# Altium footprint library PCB_CONNECTORS.PcbLib: 676 footprints (part 24 of 43)
Each footprint in its own frame and in the unit in brackets; x right, y up, seen from the top. Pads: shape width x height; smd on the part's side, far side on the other; paste and mask are expansions set on the pad; w line width, h text height; cw(c..) or ccw(c..) is an arc to the next point about the centre after c.
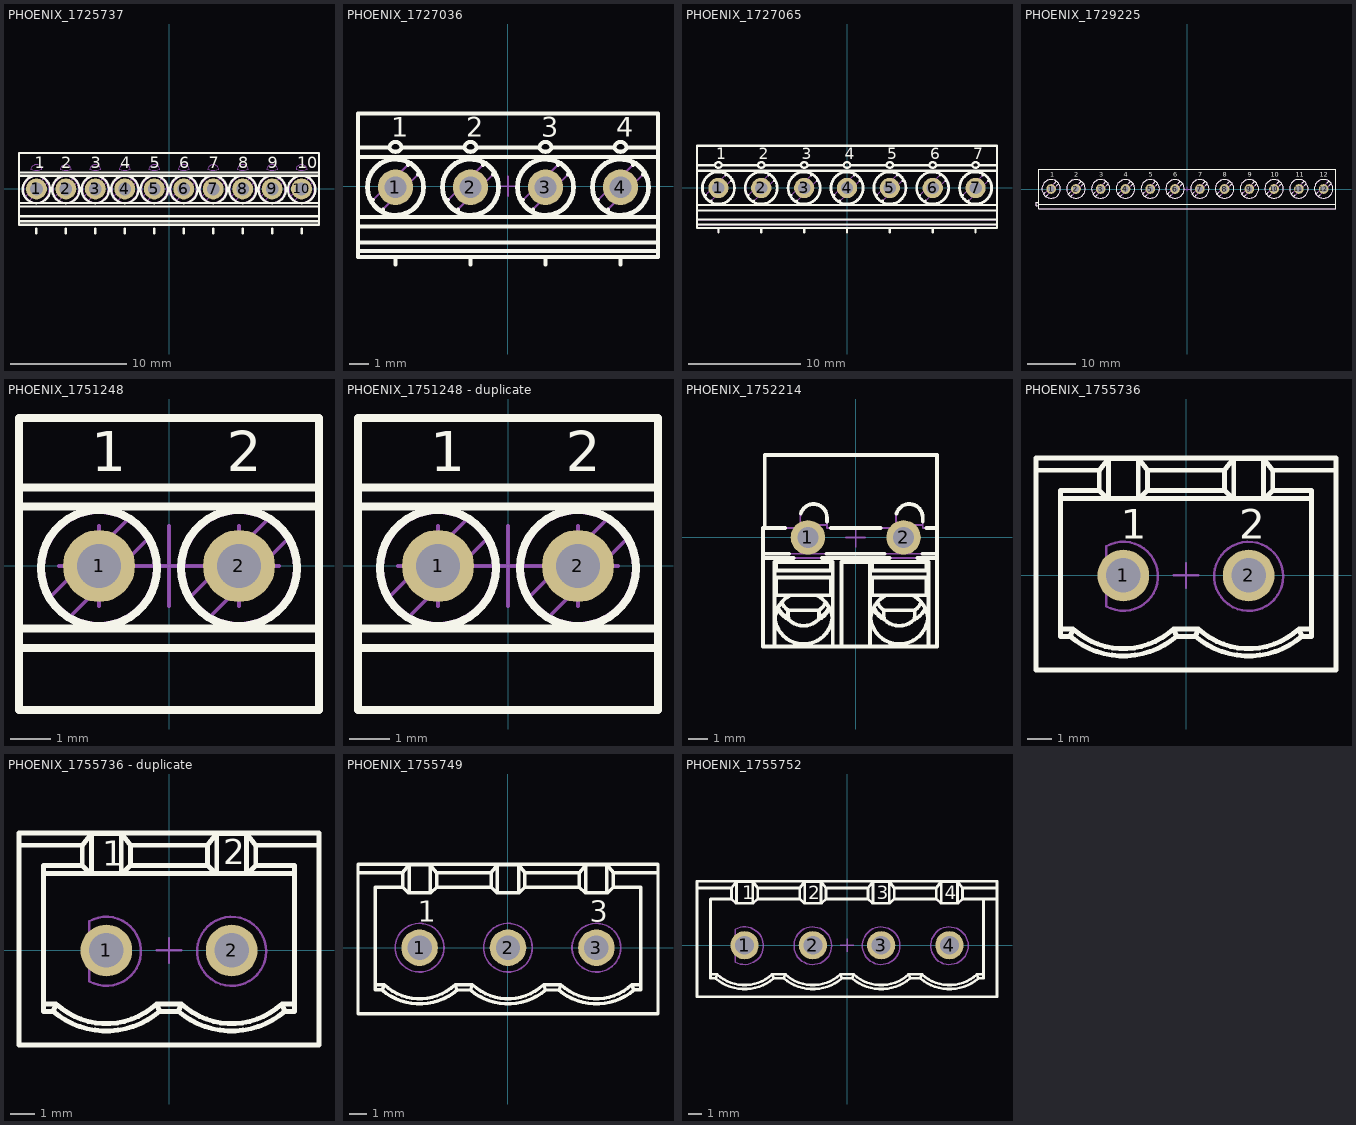
[diagram p23: the footprints below, top view; thin cyan lines are the x and y axes]

## PHOENIX_1725737 [mm] "Micro PCB Terminal Block, Pitch 2.54mm, 10 Positions, Screw Connection"
height 8.5
pads (10):
  round 1.8 hole 1.1: 1(-11.43,0) 2(-8.89,0) 3(-6.35,0) 4(-3.81,0) 5(-1.27,0) 6(1.27,0) 7(3.81,0) 8(6.35,0) 9(8.89,0) 10(11.43,0)
Top Overlay:
  circle w0.2: c-11.43,-0.05 r1.18
  circle w0.2: c-8.89,-0.05 r1.18
  circle w0.2: c-6.35,-0.05 r1.18
  circle w0.2: c-3.81,-0.05 r1.18
  circle w0.2: c-1.27,-0.05 r1.18
  circle w0.2: c1.27,-0.05 r1.18
  circle w0.2: c3.81,-0.05 r1.18
  circle w0.2: c6.35,-0.05 r1.18
  circle w0.2: c8.89,-0.05 r1.18
  circle w0.2: c11.43,-0.05 r1.18
  lines w0.2: -12.93,-2.8 12.93,-2.8 ; -12.93,-2.361 12.93,-2.361 ; -12.93,-1.51 12.93,-1.51 ; -12.93,-1.22 12.93,-1.22 ; -12.93,1.132 12.93,1.132 ; -12.93,1.417 12.93,1.417 ; -11.43,-3.81 -11.43,-3.429 ; -8.89,-3.81 -8.89,-3.429 ; -6.35,-3.81 -6.35,-3.429 ; -3.81,-3.81 -3.81,-3.429 ; -1.27,-3.81 -1.27,-3.429 ; 1.27,-3.81 1.27,-3.429 ; 3.81,-3.81 3.81,-3.429 ; 6.35,-3.81 6.35,-3.429 ; 8.89,-3.81 8.89,-3.429 ; 11.43,-3.81 11.43,-3.429 ; -12.93,-3.1 12.93,-3.1 12.93,3.1 -12.93,3.1 -12.93,-3.1
  text "9" at 8.509,1.778 h1
  text "8" at 5.969,1.778 h1
  text "6" at 0.889,1.778 h1
  text "4" at -4.191,1.778 h1
  text "1" at -11.557,1.778 h1
  text "2" at -9.271,1.778 h1
  text "3" at -6.731,1.778 h1
  text "5" at -1.651,1.778 h1
  text "7" at 3.429,1.778 h1
  text "10" at 11.049,1.778 h1
Mechanical 8:
  lines w0.1: -0.55,0 0,0 0,-0.55 ; -11.98,0 -11.43,0 ; -11.98,0 -11.43,0 ; -11.98,0 -11.43,0 ; -11.98,0 -11.43,0 ; -11.43,-0.55 -11.43,0 ; -11.43,-0.55 -11.43,0 ; -11.43,-0.55 -11.43,0 ; -11.43,-0.55 -11.43,0 ; -9.44,0 -8.89,0 ; -9.44,0 -8.89,0 ; -9.44,0 -8.89,0 ; -9.44,0 -8.89,0 ; -8.89,-0.55 -8.89,0 ; -8.89,-0.55 -8.89,0 ; -8.89,-0.55 -8.89,0 ; -8.89,-0.55 -8.89,0 ; -6.9,0 -6.35,0 ; -6.9,0 -6.35,0 ; -6.9,0 -6.35,0 ; -6.9,0 -6.35,0 ; -6.35,-0.55 -6.35,0 ; -6.35,-0.55 -6.35,0 ; -6.35,-0.55 -6.35,0 ; -6.35,-0.55 -6.35,0 ; -4.36,0 -3.81,0 ; -4.36,0 -3.81,0 ; -4.36,0 -3.81,0 ; -4.36,0 -3.81,0 ; -3.81,-0.55 -3.81,0 ; -3.81,-0.55 -3.81,0 ; -3.81,-0.55 -3.81,0 ; -3.81,-0.55 -3.81,0 ; -1.82,0 -1.27,0 ; -1.82,0 -1.27,0 ; -1.82,0 -1.27,0 ; -1.82,0 -1.27,0 ; -1.27,-0.55 -1.27,0 ; -1.27,-0.55 -1.27,0 ; -1.27,-0.55 -1.27,0 ; -1.27,-0.55 -1.27,0 ; 0.72,0 1.27,0 ; 0.72,0 1.27,0 ; 0.72,0 1.27,0 ; 0.72,0 1.27,0 ; 1.27,-0.55 1.27,0 ; 1.27,-0.55 1.27,0 ; 1.27,-0.55 1.27,0 ; 1.27,-0.55 1.27,0 ; 3.26,0 3.81,0 ; 3.26,0 3.81,0 ; 3.26,0 3.81,0 ; 3.26,0 3.81,0 ; 3.81,-0.55 3.81,0 ; 3.81,-0.55 3.81,0 ; 3.81,-0.55 3.81,0 ; 3.81,-0.55 3.81,0 ; 5.8,0 6.35,0 ; 5.8,0 6.35,0 ; 5.8,0 6.35,0 ; 5.8,0 6.35,0 ; 6.35,-0.55 6.35,0 ; 6.35,-0.55 6.35,0 ; 6.35,-0.55 6.35,0 ; 6.35,-0.55 6.35,0 ; 8.34,0 8.89,0 ; 8.34,0 8.89,0 ; 8.34,0 8.89,0 ; 8.34,0 8.89,0 ; 8.89,-0.55 8.89,0 ; 8.89,-0.55 8.89,0 ; 8.89,-0.55 8.89,0 ; 8.89,-0.55 8.89,0 ; 10.88,0 11.43,0 ; 10.88,0 11.43,0 ; 10.88,0 11.43,0 ; 10.88,0 11.43,0 ; 11.43,-0.55 11.43,0 ; 11.43,-0.55 11.43,0 ; 11.43,-0.55 11.43,0 ; 11.43,-0.55 11.43,0
Mechanical 14:
  circle w0.1: c8.89,-0.05 r1.1
  circle w0.1: c1.27,-0.05 r1.1
  circle w0.1: c-3.81,-0.05 r1.1
  circle w0.1: c-6.35,-0.05 r1.1
  circle w0.1: c-8.89,-0.05 r1.1
  circle w0.1: c-11.43,-0.05 r1.1
  circle w0.1: c-1.27,-0.05 r1.1
  circle w0.1: c3.81,-0.05 r1.1
  circle w0.1: c6.35,-0.05 r1.1
  circle w0.1: c11.43,-0.05 r1.1
  lines w0.1: -12.93,-2.8 12.93,-2.8 ; -12.93,-2.361 12.93,-2.361 ; -12.93,-1.51 12.93,-1.51 ; -12.93,-1.22 12.93,-1.22 ; -12.93,1.132 12.93,1.132 ; -12.93,1.417 12.93,1.417 ; -12.364,-0.631 -10.849,0.884 ; -12.011,-0.984 -10.496,0.531 ; -9.824,-0.631 -8.309,0.884 ; -9.471,-0.984 -7.956,0.531 ; -7.284,-0.631 -5.769,0.884 ; -6.931,-0.984 -5.416,0.531 ; -4.744,-0.631 -3.229,0.884 ; -4.391,-0.984 -2.876,0.531 ; -2.204,-0.631 -0.689,0.884 ; -1.851,-0.984 -0.336,0.531 ; 0.336,-0.631 1.851,0.884 ; 0.689,-0.984 2.204,0.531 ; 2.876,-0.631 4.391,0.884 ; 3.229,-0.984 4.744,0.531 ; 5.416,-0.631 6.931,0.884 ; 5.769,-0.984 7.284,0.531 ; 7.956,-0.631 9.471,0.884 ; 8.309,-0.984 9.824,0.531 ; 10.496,-0.631 12.011,0.884 ; 10.849,-0.984 12.364,0.531 ; -12.93,-3.1 12.93,-3.1 12.93,3.1 -12.93,3.1 -12.93,-3.1 ; -11.905,1.757 cw(c-11.43,1.6) -10.955,1.757 cw(c-11.003,1.741) -10.982,1.696 cw(c-11.43,2.696) -11.878,1.696 cw(c-11.857,1.741) -11.905,1.757 ; -9.365,1.757 cw(c-8.89,1.6) -8.415,1.757 cw(c-8.463,1.741) -8.442,1.696 cw(c-8.89,2.696) -9.338,1.696 cw(c-9.317,1.741) -9.365,1.757 ; -6.825,1.757 cw(c-6.35,1.6) -5.875,1.757 cw(c-5.923,1.741) -5.902,1.696 cw(c-6.35,2.696) -6.798,1.696 cw(c-6.777,1.741) -6.825,1.757 ; -4.285,1.757 cw(c-3.81,1.6) -3.335,1.757 cw(c-3.383,1.741) -3.362,1.696 cw(c-3.81,2.696) -4.258,1.696 cw(c-4.237,1.741) -4.285,1.757 ; -1.745,1.757 cw(c-1.27,1.6) -0.795,1.757 cw(c-0.843,1.741) -0.822,1.696 cw(c-1.27,2.696) -1.718,1.696 cw(c-1.697,1.741) -1.745,1.757 ; 0.795,1.757 cw(c1.27,1.6) 1.745,1.757 cw(c1.697,1.741) 1.718,1.696 cw(c1.27,2.696) 0.822,1.696 cw(c0.843,1.741) 0.795,1.757 ; 3.335,1.757 cw(c3.81,1.6) 4.285,1.757 cw(c4.237,1.741) 4.258,1.696 cw(c3.81,2.696) 3.362,1.696 cw(c3.383,1.741) 3.335,1.757 ; 5.875,1.757 cw(c6.35,1.6) 6.825,1.757 cw(c6.777,1.741) 6.798,1.696 cw(c6.35,2.696) 5.902,1.696 cw(c5.923,1.741) 5.875,1.757 ; 8.415,1.757 cw(c8.89,1.6) 9.365,1.757 cw(c9.317,1.741) 9.338,1.696 cw(c8.89,2.696) 8.442,1.696 cw(c8.463,1.741) 8.415,1.757 ; 10.955,1.757 ccw(c11.003,1.741) 10.982,1.696 ccw(c11.43,2.696) 11.878,1.696 ccw(c11.857,1.741) 11.905,1.757 ccw(c11.43,1.6) 10.955,1.757
3D body "PHOENIX_1725737.stp": height 8.5, standoff -3.5, extent -12.93,-3.1 12.93,3.1

## PHOENIX_1727036 [mm] "PCB Terminal Block, Pitch 3.81mm, 4 Positions, Screw Connection"
height 8.5
pads (4):
  round 1.8 hole 1.1: 1(-5.715,-0.05) 2(-1.905,-0.05) 3(1.905,-0.05) 4(5.715,-0.05)
Top Overlay:
  circle w0.2: c-5.715,-0.05 r1.4
  circle w0.2: c-1.905,-0.05 r1.4
  circle w0.2: c1.905,-0.05 r1.4
  circle w0.2: c5.715,-0.05 r1.4
  circle w0.2: c-5.715,-0.05 r1.45
  circle w0.2: c-1.905,-0.05 r1.45
  circle w0.2: c5.715,-0.05 r1.45
  circle w0.2: c1.905,-0.05 r1.45
  lines w0.2: -7.62,-3.3 7.62,-3.3 ; -7.62,-2.861 7.62,-2.861 ; -7.62,-2.049 7.62,-2.049 ; -7.62,-1.566 7.62,-1.566 ; -7.62,1.487 7.62,1.487 ; -7.62,1.962 -6.017,1.962 ; -6.921,-0.761 -6.848,-0.688 ; -6.426,-1.256 -6.353,-1.183 ; -5.715,-3.981 -5.715,-3.6 ; -5.413,1.962 -2.207,1.962 ; -5.077,1.083 -5.004,1.156 ; -4.582,0.588 -4.509,0.661 ; -3.111,-0.761 -3.038,-0.688 ; -2.616,-1.256 -2.543,-1.183 ; -1.905,-3.981 -1.905,-3.6 ; -1.603,1.962 1.603,1.962 ; -1.267,1.083 -1.194,1.156 ; -0.772,0.588 -0.699,0.661 ; 0.699,-0.761 0.772,-0.688 ; 1.194,-1.256 1.267,-1.183 ; 1.905,-3.981 1.905,-3.6 ; 2.207,1.962 5.413,1.962 ; 2.543,1.083 2.616,1.156 ; 3.038,0.588 3.111,0.661 ; 4.509,-0.761 4.582,-0.688 ; 5.004,-1.256 5.077,-1.183 ; 5.715,-3.981 5.715,-3.6 ; 6.017,1.962 7.62,1.962 ; 6.353,1.083 6.426,1.156 ; 6.848,0.588 6.921,0.661 ; -7.62,-3.6 -7.62,3.7 7.62,3.7 7.62,-3.6 -7.62,-3.6 ; -6.016,1.923 ccw(c-5.715,2.098) -5.414,1.923 ccw(c-5.715,1.948) -6.016,1.923 ; -2.206,1.923 ccw(c-1.905,2.098) -1.604,1.923 ccw(c-1.905,1.948) -2.206,1.923 ; 1.604,1.923 ccw(c1.905,2.098) 2.206,1.923 ccw(c1.905,1.948) 1.604,1.923 ; 5.414,1.923 ccw(c5.715,2.098) 6.016,1.923 ccw(c5.715,1.948) 5.414,1.923
  text "1" at -5.925,2.525 h1
  text "2" at -2.115,2.525 h1
  text "3" at 1.695,2.525 h1
  text "4" at 5.505,2.525 h1
Mechanical 8:
  lines w0.1: -6.215,-0.05 -5.715,-0.05 ; -5.715,-0.55 -5.715,-0.05 ; -5.715,0.45 -5.715,-0.05 ; -5.215,-0.05 -5.715,-0.05 ; -2.405,-0.05 -1.905,-0.05 ; -1.905,-0.55 -1.905,-0.05 ; -1.905,0.45 -1.905,-0.05 ; -1.405,-0.05 -1.905,-0.05 ; -0.5,0 0,0 ; 0,-0.5 0,0 ; 0,0.5 0,0 ; 0.5,0 0,0 ; 1.405,-0.05 1.905,-0.05 ; 1.905,-0.55 1.905,-0.05 ; 1.905,0.45 1.905,-0.05 ; 2.405,-0.05 1.905,-0.05 ; 5.215,-0.05 5.715,-0.05 ; 5.715,-0.55 5.715,-0.05 ; 5.715,0.45 5.715,-0.05 ; 6.215,-0.05 5.715,-0.05
Mechanical 14:
  circle w0.1: c-5.715,-0.05 r1.4
  circle w0.1: c-1.905,-0.05 r1.4
  circle w0.1: c1.905,-0.05 r1.4
  circle w0.1: c5.715,-0.05 r1.4
  circle w0.1: c-5.715,-0.05 r1.45
  circle w0.1: c-1.905,-0.05 r1.45
  circle w0.1: c5.715,-0.05 r1.45
  circle w0.1: c1.905,-0.05 r1.45
  lines w0.1: -7.62,-3.3 7.62,-3.3 ; -7.62,-2.861 7.62,-2.861 ; -7.62,-2.049 7.62,-2.049 ; -7.62,-1.566 7.62,-1.566 ; -7.62,1.487 7.62,1.487 ; -7.62,1.962 -6.017,1.962 ; -6.921,-0.761 -5.004,1.156 ; -6.426,-1.256 -4.509,0.661 ; -5.715,-3.981 -5.715,-3.6 ; -5.413,1.962 -2.207,1.962 ; -3.111,-0.761 -1.194,1.156 ; -2.616,-1.256 -0.699,0.661 ; -1.905,-3.981 -1.905,-3.6 ; -1.603,1.962 1.603,1.962 ; 0.699,-0.761 2.616,1.156 ; 1.194,-1.256 3.111,0.661 ; 1.905,-3.981 1.905,-3.6 ; 2.207,1.962 5.413,1.962 ; 4.509,-0.761 6.426,1.156 ; 5.004,-1.256 6.921,0.661 ; 5.715,-3.981 5.715,-3.6 ; 6.017,1.962 7.62,1.962 ; -7.62,-3.6 -7.62,3.7 7.62,3.7 7.62,-3.6 -7.62,-3.6 ; -6.016,1.923 ccw(c-5.715,2.098) -5.414,1.923 ccw(c-5.715,1.948) -6.016,1.923 ; -2.206,1.923 ccw(c-1.905,2.098) -1.604,1.923 ccw(c-1.905,1.948) -2.206,1.923 ; 1.604,1.923 ccw(c1.905,2.098) 2.206,1.923 ccw(c1.905,1.948) 1.604,1.923 ; 5.414,1.923 ccw(c5.715,2.098) 6.016,1.923 ccw(c5.715,1.948) 5.414,1.923
  text "1" at -5.925,2.525 h1
  text "2" at -2.115,2.525 h1
  text "3" at 1.695,2.525 h1
  text "4" at 5.505,2.525 h1
3D body "PHOENIX_1727036.stp": height 8.5, standoff -3.5, extent -7.62,-3.6 7.62,3.7

## PHOENIX_1727065 [mm] "PCB Terminal Block, Pitch 3.81mm, 7 Positions, Screw Connection"
height 8.5
pads (7):
  round 1.8 hole 1.1: 1(-11.43,0) 2(-7.62,0) 3(-3.81,0) 4(0,0) 5(3.81,0) 6(7.62,0) 7(11.43,0)
Top Overlay:
  circle w0.2: c-11.43,0 r1.45
  circle w0.2: c-11.43,0 r1.4
  circle w0.2: c-7.62,0 r1.45
  circle w0.2: c-7.62,0 r1.4
  circle w0.2: c-3.81,0 r1.45
  circle w0.2: c-3.81,0 r1.4
  circle w0.2: c0,0 r1.45
  circle w0.2: c0,0 r1.4
  circle w0.2: c3.81,0 r1.45
  circle w0.2: c3.81,0 r1.4
  circle w0.2: c7.62,0 r1.45
  circle w0.2: c7.62,0 r1.4
  circle w0.2: c11.43,0 r1.45
  circle w0.2: c11.43,0 r1.4
  lines w0.2: -13.335,-3.25 13.335,-3.25 ; -13.335,-2.811 13.335,-2.811 ; -13.335,-1.999 13.335,-1.999 ; -13.335,-1.516 13.335,-1.516 ; -13.335,1.537 13.335,1.537 ; -13.335,2.012 -11.732,2.012 ; -12.636,-0.711 -12.563,-0.638 ; -12.141,-1.206 -12.068,-1.133 ; -11.43,-3.931 -11.43,-3.55 ; -11.128,2.012 -7.922,2.012 ; -10.792,1.133 -10.719,1.206 ; -10.297,0.638 -10.224,0.711 ; -8.826,-0.711 -8.753,-0.638 ; -8.331,-1.206 -8.258,-1.133 ; -7.62,-3.931 -7.62,-3.55 ; -7.318,2.012 -4.112,2.012 ; -6.982,1.133 -6.909,1.206 ; -6.487,0.638 -6.414,0.711 ; -5.016,-0.711 -4.943,-0.638 ; -4.521,-1.206 -4.448,-1.133 ; -3.81,-3.931 -3.81,-3.55 ; -3.508,2.012 -0.302,2.012 ; -3.172,1.133 -3.099,1.206 ; -2.677,0.638 -2.604,0.711 ; -1.206,-0.711 -1.133,-0.638 ; -0.711,-1.206 -0.638,-1.133 ; 0,-3.931 0,-3.55 ; 0.302,2.012 3.508,2.012 ; 0.638,1.133 0.711,1.206 ; 1.133,0.638 1.206,0.711 ; 2.604,-0.711 2.677,-0.638 ; 3.099,-1.206 3.172,-1.133 ; 3.81,-3.931 3.81,-3.55 ; 4.112,2.012 7.318,2.012 ; 4.448,1.133 4.521,1.206 ; 4.943,0.638 5.016,0.711 ; 6.414,-0.711 6.487,-0.638 ; 6.909,-1.206 6.982,-1.133 ; 7.62,-3.931 7.62,-3.55 ; 7.922,2.012 11.128,2.012 ; 8.258,1.133 8.331,1.206 ; 8.753,0.638 8.826,0.711 ; 10.224,-0.711 10.297,-0.638 ; 10.719,-1.206 10.792,-1.133 ; 11.43,-3.931 11.43,-3.55 ; 11.732,2.012 13.335,2.012 ; 12.068,1.133 12.141,1.206 ; 12.563,0.638 12.636,0.711 ; -13.335,-3.55 13.335,-3.55 13.335,3.75 -13.335,3.75 -13.335,-3.55 ; -11.731,1.973 cw(c-11.43,1.998) -11.129,1.973 cw(c-11.43,2.148) -11.731,1.973 ; -7.921,1.973 cw(c-7.62,1.998) -7.319,1.973 cw(c-7.62,2.148) -7.921,1.973 ; -4.111,1.973 cw(c-3.81,1.998) -3.509,1.973 cw(c-3.81,2.148) -4.111,1.973 ; -0.301,1.973 cw(c0,1.998) 0.301,1.973 cw(c0,2.148) -0.301,1.973 ; 3.509,1.973 cw(c3.81,1.998) 4.111,1.973 cw(c3.81,2.148) 3.509,1.973 ; 7.319,1.973 cw(c7.62,1.998) 7.921,1.973 cw(c7.62,2.148) 7.319,1.973 ; 11.129,1.973 cw(c11.43,1.998) 11.731,1.973 cw(c11.43,2.148) 11.129,1.973
  text "7" at 11.22,2.575 h1
  text "6" at 7.41,2.575 h1
  text "5" at 3.6,2.575 h1
  text "4" at -0.21,2.575 h1
  text "3" at -4.02,2.575 h1
  text "2" at -7.83,2.575 h1
  text "1" at -11.64,2.575 h1
Mechanical 8:
  lines w0.1: -11.93,0 -11.43,0 ; -11.43,-0.5 -11.43,0 ; -11.43,0.5 -11.43,0 ; -10.93,0 -11.43,0 ; -8.12,0 -7.62,0 ; -7.62,-0.5 -7.62,0 ; -7.62,0.5 -7.62,0 ; -7.12,0 -7.62,0 ; -4.31,0 -3.81,0 ; -3.81,-0.5 -3.81,0 ; -3.81,0.5 -3.81,0 ; -3.31,0 -3.81,0 ; 3.31,0 3.81,0 ; 3.81,-0.5 3.81,0 ; 3.81,0.5 3.81,0 ; 4.31,0 3.81,0 ; 7.12,0 7.62,0 ; 7.62,-0.5 7.62,0 ; 7.62,0.5 7.62,0 ; 8.12,0 7.62,0 ; 10.93,0 11.43,0 ; 11.43,-0.5 11.43,0 ; 11.43,0.5 11.43,0 ; 11.93,0 11.43,0 ; 0,0 0,0.5 0,0 ; 0,0 0.5,0 0,0 ; 0,0 0,-0.5 0,0 ; 0,0 -0.5,0 0,0
Mechanical 14:
  circle w0.1: c-11.43,0 r1.45
  circle w0.1: c-11.43,0 r1.4
  circle w0.1: c-7.62,0 r1.45
  circle w0.1: c-7.62,0 r1.4
  circle w0.1: c-3.81,0 r1.45
  circle w0.1: c-3.81,0 r1.4
  circle w0.1: c0,0 r1.45
  circle w0.1: c0,0 r1.4
  circle w0.1: c3.81,0 r1.45
  circle w0.1: c3.81,0 r1.4
  circle w0.1: c7.62,0 r1.45
  circle w0.1: c7.62,0 r1.4
  circle w0.1: c11.43,0 r1.45
  circle w0.1: c11.43,0 r1.4
  lines w0.1: -13.335,-3.25 13.335,-3.25 ; -13.335,-2.811 13.335,-2.811 ; -13.335,-1.999 13.335,-1.999 ; -13.335,-1.516 13.335,-1.516 ; -13.335,1.537 13.335,1.537 ; -13.335,2.012 -11.732,2.012 ; -12.636,-0.711 -10.719,1.206 ; -12.141,-1.206 -10.224,0.711 ; -11.43,-3.931 -11.43,-3.55 ; -11.128,2.012 -7.922,2.012 ; -8.826,-0.711 -6.909,1.206 ; -8.331,-1.206 -6.414,0.711 ; -7.62,-3.931 -7.62,-3.55 ; -7.318,2.012 -4.112,2.012 ; -5.016,-0.711 -3.099,1.206 ; -4.521,-1.206 -2.604,0.711 ; -3.81,-3.931 -3.81,-3.55 ; -3.508,2.012 -0.302,2.012 ; -1.206,-0.711 0.711,1.206 ; -0.711,-1.206 1.206,0.711 ; 0,-3.931 0,-3.55 ; 0.302,2.012 3.508,2.012 ; 2.604,-0.711 4.521,1.206 ; 3.099,-1.206 5.016,0.711 ; 3.81,-3.931 3.81,-3.55 ; 4.112,2.012 7.318,2.012 ; 6.414,-0.711 8.331,1.206 ; 6.909,-1.206 8.826,0.711 ; 7.62,-3.931 7.62,-3.55 ; 7.922,2.012 11.128,2.012 ; 10.224,-0.711 12.141,1.206 ; 10.719,-1.206 12.636,0.711 ; 11.43,-3.931 11.43,-3.55 ; 11.732,2.012 13.335,2.012 ; -13.335,-3.55 13.335,-3.55 13.335,3.75 -13.335,3.75 -13.335,-3.55 ; -11.731,1.973 cw(c-11.43,1.998) -11.129,1.973 cw(c-11.43,2.148) -11.731,1.973 ; -7.921,1.973 cw(c-7.62,1.998) -7.319,1.973 cw(c-7.62,2.148) -7.921,1.973 ; -4.111,1.973 cw(c-3.81,1.998) -3.509,1.973 cw(c-3.81,2.148) -4.111,1.973 ; -0.301,1.973 cw(c0,1.998) 0.301,1.973 cw(c0,2.148) -0.301,1.973 ; 3.509,1.973 cw(c3.81,1.998) 4.111,1.973 cw(c3.81,2.148) 3.509,1.973 ; 7.319,1.973 cw(c7.62,1.998) 7.921,1.973 cw(c7.62,2.148) 7.319,1.973 ; 11.129,1.973 cw(c11.43,1.998) 11.731,1.973 cw(c11.43,2.148) 11.129,1.973
  text "7" at 11.22,2.575 h1
  text "6" at 7.41,2.575 h1
  text "5" at 3.6,2.575 h1
  text "4" at -0.21,2.575 h1
  text "3" at -4.02,2.575 h1
  text "2" at -7.83,2.575 h1
  text "1" at -11.64,2.575 h1
3D body "PHOENIX_1727065.stp": height 8.5, standoff -3.5, extent -13.335,-3.6 13.335,3.7

## PHOENIX_1729225 [mm] "Terminal Block, 13.5A 400V, Pitch 5.08mm, 12 Positions, Screw Connection"
height 10
pads (12):
  round 2 hole 1.3: 1(-27.94,0) 2(-22.86,0) 3(-17.78,0) 4(-12.7,0) 5(-7.62,0) 6(-2.54,0) 7(2.54,0) 8(7.62,0) 9(12.7,0) 10(17.78,0) 11(22.86,0) 12(27.94,0)
Top Overlay:
  circle w0.2: c-27.94,0.025 r1.9
  circle w0.2: c-22.86,0.025 r1.9
  circle w0.2: c-17.78,0.025 r1.9
  circle w0.2: c-12.7,0.025 r1.9
  circle w0.2: c-7.62,0.025 r1.9
  circle w0.2: c-2.54,0.025 r1.9
  circle w0.2: c2.54,0.025 r1.9
  circle w0.2: c7.62,0.025 r1.9
  circle w0.2: c12.7,0.025 r1.9
  circle w0.2: c17.78,0.025 r1.9
  circle w0.2: c22.86,0.05 r1.9
  circle w0.2: c27.94,0.05 r1.9
  lines w0.2: -30.48,-3.327 -30.609,-3.327 -30.787,-3.477 -31.05,-3.477 -31.05,-2.763 -30.787,-2.763 -30.609,-2.913 -30.48,-2.913 ; -30.48,-3.128 30.48,-3.128 ; -29.508,-1.048 -29.155,-0.695 ; -29.013,-1.543 -28.667,-1.197 ; -27.245,1.215 -26.867,1.593 ; -26.743,0.727 -26.372,1.098 ; -24.428,-1.048 -24.075,-0.695 ; -23.933,-1.543 -23.587,-1.197 ; -22.165,1.215 -21.787,1.593 ; -21.663,0.727 -21.292,1.098 ; -19.348,-1.048 -18.995,-0.695 ; -18.853,-1.543 -18.507,-1.197 ; -17.085,1.215 -16.707,1.593 ; -16.583,0.727 -16.212,1.098 ; -14.268,-1.048 -13.915,-0.695 ; -13.773,-1.543 -13.427,-1.197 ; -12.005,1.215 -11.627,1.593 ; -11.503,0.727 -11.132,1.098 ; -9.188,-1.048 -8.835,-0.695 ; -8.693,-1.543 -8.347,-1.197 ; -6.925,1.215 -6.547,1.593 ; -6.423,0.727 -6.052,1.098 ; -4.108,-1.048 -3.755,-0.695 ; -3.613,-1.543 -3.267,-1.197 ; -1.845,1.215 -1.467,1.593 ; -1.343,0.727 -0.972,1.098 ; 0.972,-1.048 1.325,-0.695 ; 1.467,-1.543 1.813,-1.197 ; 3.235,1.215 3.613,1.593 ; 3.737,0.727 4.108,1.098 ; 6.052,-1.048 6.405,-0.695 ; 6.547,-1.543 6.893,-1.197 ; 8.315,1.215 8.693,1.593 ; 8.817,0.727 9.188,1.098 ; 11.132,-1.048 11.485,-0.695 ; 11.627,-1.543 11.973,-1.197 ; 13.395,1.215 13.773,1.593 ; 13.897,0.727 14.268,1.098 ; 16.212,-1.048 16.565,-0.695 ; 16.707,-1.543 17.053,-1.197 ; 18.475,1.215 18.853,1.593 ; 18.977,0.727 19.348,1.098 ; 21.292,-1.023 21.645,-0.67 ; 21.787,-1.518 22.133,-1.172 ; 23.555,1.24 23.933,1.618 ; 24.057,0.752 24.428,1.123 ; 26.372,-1.023 26.725,-0.67 ; 26.867,-1.518 27.213,-1.172 ; 28.635,1.24 29.013,1.618 ; 29.137,0.752 29.508,1.123 ; -30.48,-4.05 30.48,-4.05 30.48,4.05 -30.48,4.05 -30.48,-4.05
  text "12" at 27.146,2.508 h1
  text "11" at 22.225,2.508 h1
  text "10" at 17.145,2.508 h1
  text "9" at 12.383,2.508 h1
  text "1" at -28.099,2.508 h1
  text "2" at -23.177,2.508 h1
  text "3" at -18.097,2.508 h1
  text "4" at -13.017,2.508 h1
  text "5" at -7.937,2.508 h1
  text "6" at -2.857,2.508 h1
  text "7" at 2.223,2.508 h1
  text "8" at 7.303,2.508 h1
Mechanical 8:
  lines w0.1: -28.44,0 -27.94,0 ; -27.94,-0.5 -27.94,0 ; -27.94,0.5 -27.94,0 ; -27.44,0 -27.94,0 ; -23.36,0 -22.86,0 ; -22.86,-0.5 -22.86,0 ; -22.86,0.5 -22.86,0 ; -22.36,0 -22.86,0 ; -18.28,0 -17.78,0 ; -17.78,-0.5 -17.78,0 ; -17.78,0.5 -17.78,0 ; -17.28,0 -17.78,0 ; -13.2,0 -12.7,0 ; -12.7,-0.5 -12.7,0 ; -12.7,0.5 -12.7,0 ; -12.2,0 -12.7,0 ; -8.12,0 -7.62,0 ; -7.62,-0.5 -7.62,0 ; -7.62,0.5 -7.62,0 ; -7.12,0 -7.62,0 ; -3.04,0 -2.54,0 ; -2.54,-0.5 -2.54,0 ; -2.54,0.5 -2.54,0 ; -2.04,0 -2.54,0 ; -0.5,0 0,0 ; 0,-0.5 0,0 ; 0,0.5 0,0 ; 0.5,0 0,0 ; 2.04,0 2.54,0 ; 2.54,-0.5 2.54,0 ; 2.54,0.5 2.54,0 ; 3.04,0 2.54,0 ; 7.12,0 7.62,0 ; 7.62,-0.5 7.62,0 ; 7.62,0.5 7.62,0 ; 8.12,0 7.62,0 ; 12.2,0 12.7,0 ; 12.7,-0.5 12.7,0 ; 12.7,0.5 12.7,0 ; 13.2,0 12.7,0 ; 17.28,0 17.78,0 ; 17.78,-0.5 17.78,0 ; 17.78,0.5 17.78,0 ; 18.28,0 17.78,0 ; 22.36,0.025 22.86,0.025 ; 22.86,-0.475 22.86,0.025 ; 22.86,0.525 22.86,0.025 ; 23.36,0.025 22.86,0.025 ; 27.44,0.025 27.94,0.025 ; 27.94,-0.475 27.94,0.025 ; 27.94,0.525 27.94,0.025 ; 28.44,0.025 27.94,0.025
Mechanical 14:
  circle w0.1: c-27.94,0.025 r1.9
  circle w0.1: c-22.86,0.025 r1.9
  circle w0.1: c-17.78,0.025 r1.9
  circle w0.1: c-12.7,0.025 r1.9
  circle w0.1: c-7.62,0.025 r1.9
  circle w0.1: c-2.54,0.025 r1.9
  circle w0.1: c2.54,0.025 r1.9
  circle w0.1: c7.62,0.025 r1.9
  circle w0.1: c12.7,0.025 r1.9
  circle w0.1: c17.78,0.025 r1.9
  circle w0.1: c22.86,0.025 r1.9
  circle w0.1: c27.94,0.025 r1.9
  lines w0.1: -30.48,-3.327 -30.609,-3.327 -30.787,-3.477 -31.05,-3.477 -31.05,-2.763 -30.787,-2.763 -30.609,-2.913 -30.48,-2.913 ; -30.48,-3.128 30.48,-3.128 ; -29.508,-1.048 -26.867,1.593 ; -29.013,-1.543 -26.372,1.098 ; -24.428,-1.048 -21.787,1.593 ; -23.933,-1.543 -21.292,1.098 ; -19.348,-1.048 -16.707,1.593 ; -18.853,-1.543 -16.212,1.098 ; -14.268,-1.048 -11.627,1.593 ; -13.773,-1.543 -11.132,1.098 ; -9.188,-1.048 -6.547,1.593 ; -8.693,-1.543 -6.052,1.098 ; -4.108,-1.048 -1.467,1.593 ; -3.613,-1.543 -0.972,1.098 ; 0.972,-1.048 3.613,1.593 ; 1.467,-1.543 4.108,1.098 ; 6.052,-1.048 8.693,1.593 ; 6.547,-1.543 9.188,1.098 ; 11.132,-1.048 13.773,1.593 ; 11.627,-1.543 14.268,1.098 ; 16.212,-1.048 18.853,1.593 ; 16.707,-1.543 19.348,1.098 ; 21.292,-1.048 23.933,1.593 ; 21.787,-1.543 24.428,1.098 ; 26.372,-1.048 29.013,1.593 ; 26.867,-1.543 29.508,1.098 ; -30.48,-4.05 30.48,-4.05 30.48,4.05 -30.48,4.05 -30.48,-4.05
  text "12" at 27.146,2.508 h1
  text "11" at 22.225,2.508 h1
  text "10" at 17.145,2.508 h1
  text "9" at 12.383,2.508 h1
  text "1" at -28.099,2.508 h1
  text "2" at -23.177,2.508 h1
  text "3" at -18.097,2.508 h1
  text "4" at -13.017,2.508 h1
  text "5" at -7.937,2.508 h1
  text "6" at -2.857,2.508 h1
  text "7" at 2.223,2.508 h1
  text "8" at 7.303,2.508 h1
3D body "PHOENIX_1729225.stp": height 10, standoff -3.5, extent -31.05,-4.05 30.48,4.05
